# Altium footprint library Connectors.PcbLib: 133 footprints (part 9 of 9)
Each footprint in its own frame and in the unit in brackets; x right, y up, seen from the top. Pads: shape width x height; smd on the part's side, far side on the other; paste and mask are expansions set on the pad; w line width, h text height; cw(c..) or ccw(c..) is an arc to the next point about the centre after c.
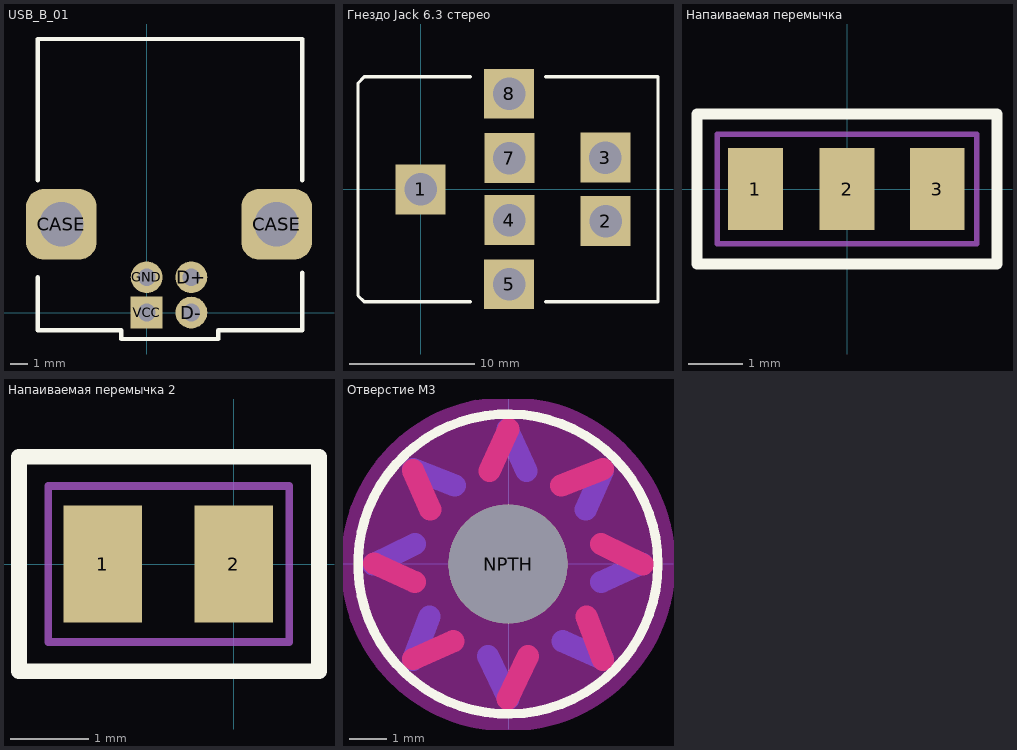
[diagram p8: the footprints below, top view; thin cyan lines are the x and y axes]

## USB_B_01 [mm]
height 12
pads (6):
  rrect50% 4x4 hole 2.5: CASE(-4.83,5) CASE(7.37,5)
  round 1.8 hole 1: D+(2.54,2) D-(2.54,0) GND(0,2)
  rect 1.8x1.8 hole 1: VCC(0,0)
Top Overlay:
  lines w0.254: -6.18,2 -6.18,-1 -1.43,-1 -1.43,-1.5 4.07,-1.5 4.07,-1 8.82,-1 8.82,2.25 ; -6.18,7.5 -6.18,15.5 8.82,15.5 8.82,7.5
3D body "USB-B-S-F-B-TH.step": height 10.55, standoff -3.67, extent -6.159,-0.9 8.699,15.4

## Гнездо Jack 6.3 стерео [mm]
pads (7):
  rect 4x4 hole 2.6: 1(0,0) 2(14.808,-2.54) 3(14.783,2.54) 4(7.112,-2.464) 5(7.087,-7.595) 7(7.112,2.489) 8(7.087,7.645)
Top Overlay:
  lines w0.254: 4,-9 -4.5,-9 -5,-8.5 -5,8.5 -4.5,9 4,9 ; 10,-9 19,-9 19,9 10,9
3D body "Гнездо 6.3мм длинное .STEP": height 14.2, standoff -4.5, extent -16.6,-9 19,9

## Напаиваемая перемычка [mm]
pads (3):
  rect 1x1.5 smd: 1(-1.678,0) 2(0,0) 3(1.652,0)
Top Overlay:
  lines w0.2: -2.75,-1.375 -2.75,1.375 2.75,1.375 2.75,-1.375 -2.75,-1.375
Mechanical 15:
  lines w0.1: -2.375,-1 -2.375,1 2.375,1 2.375,-1 -2.375,-1

## Напаиваемая перемычка 2 [mm]
pads (2):
  rect 1x1.5 smd: 1(-1.678,0) 2(0,0)
Top Overlay:
  lines w0.2: -2.75,-1.375 1.092,-1.375 1.092,1.375 -2.75,1.375 -2.75,-1.375
Mechanical 15:
  lines w0.1: -2.375,-1 0.711,-1 0.711,1 -2.375,1 -2.375,-1

## Отверстие M3 [mm] "3.6мм. 7 мм метализация"
pads (1):
  round 3.2 hole 3.2 unplated: NPTH(-0.014,-0.012)
Top Layer:
  lines w0.6: -3.607,0 -2.521,-0.495 ; -2.565,-2.565 -1.482,-2.082 ; -2.565,2.515 -2.101,1.452 ; -0.51,2.486 0,3.607 ; -0.025,-3.632 0.523,-2.488 ; 1.42,2.095 2.54,2.54 ; 2.095,-1.42 2.54,-2.591 ; 2.485,0.527 3.607,-0.025
Bottom Layer:
  lines w0.6: -3.634,-0.025 -2.513,0.527 ; -2.567,-2.591 -2.122,-1.42 ; -2.567,2.54 -1.447,2.095 ; -0.55,-2.488 -0.002,-3.632 ; -0.027,3.607 0.483,2.486 ; 1.455,-2.082 2.538,-2.565 ; 2.073,1.452 2.538,2.515 ; 2.494,-0.495 3.58,0
Top Overlay:
  circle w0.254: c-0.014,-0.012 r4.029
Bottom Overlay:
  circle w0.254: c-0.014,-0.012 r4.029
Top Solder:
  lines w0.8: -3.607,0 -2.521,-0.495 ; -2.565,-2.565 -1.482,-2.082 ; -2.565,2.515 -2.101,1.452 ; -0.51,2.461 0,3.607 ; -0.025,-3.632 0.523,-2.488 ; 1.42,2.095 2.54,2.54 ; 2.095,-1.42 2.54,-2.591 ; 2.485,0.527 3.607,-0.025
Bottom Solder:
  lines w0.8: -3.634,-0.025 -2.513,0.527 ; -2.567,-2.591 -2.122,-1.42 ; -2.567,2.54 -1.447,2.095 ; -0.55,-2.488 -0.002,-3.632 ; -0.027,3.607 0.483,2.461 ; 1.455,-2.082 2.538,-2.565 ; 2.073,1.452 2.538,2.515 ; 2.494,-0.495 3.58,0
Keep-Out Layer:
  circle w7: c-0.014,-0.012 r1